# Altium footprint library PCB_Footprints.PcbLib: 303 footprints (part 13 of 19)
Each footprint in its own frame and in the unit in brackets; x right, y up, seen from the top. Pads: shape width x height; smd on the part's side, far side on the other; paste and mask are expansions set on the pad; w line width, h text height; cw(c..) or ccw(c..) is an arc to the next point about the centre after c.
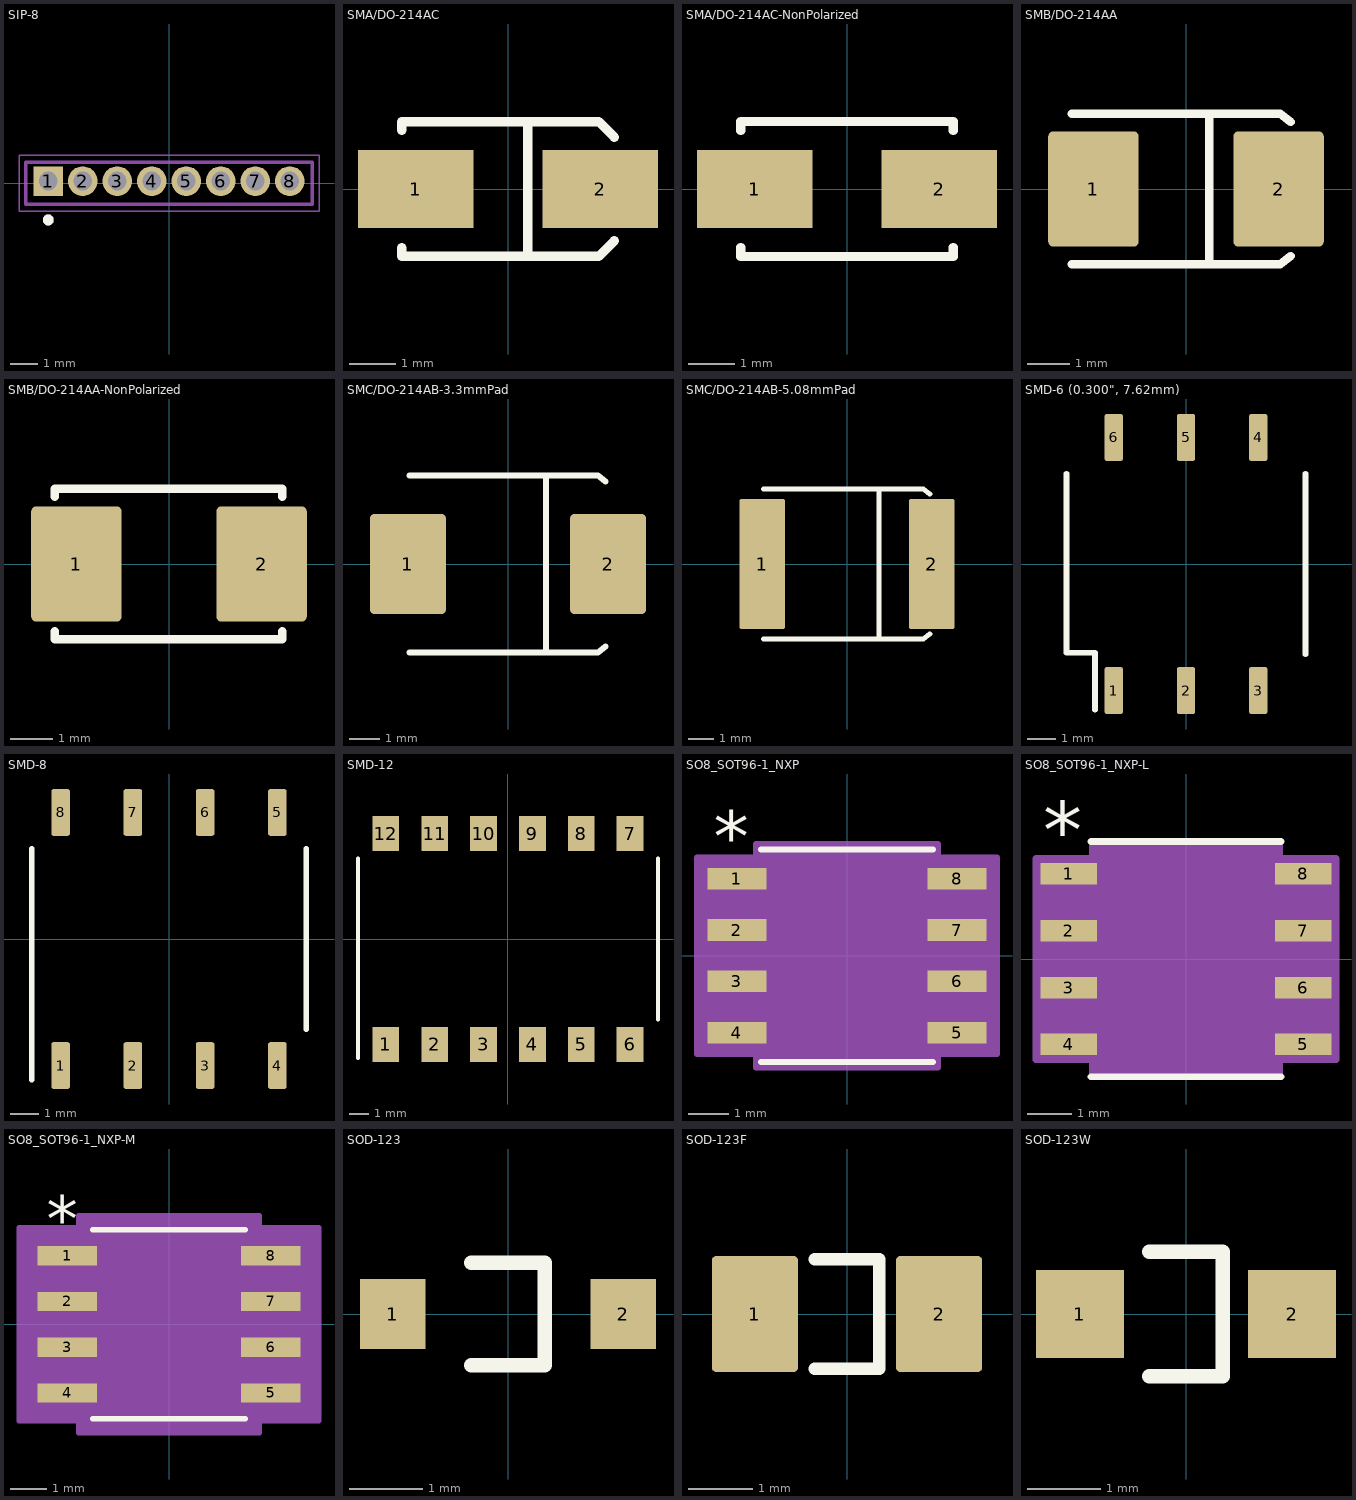
[diagram p12: the footprints below, top view; thin cyan lines are the x and y axes]

## SIP-8 [mm]
pads (8):
  rect 1.09x1.09 hole 0.69: 1(-4.445,0.078)
  round 1.09 hole 0.69: 2(-3.175,0.078) 3(-1.905,0.078) 4(-0.635,0.078) 5(0.635,0.078) 6(1.905,0.078) 7(3.175,0.078) 8(4.445,0.078)
Top Overlay:
  circle w0.2: c-4.445,-1.35 r0.1
Mechanical 13:
  circle w0.2: c-4.445,-1.35 r0.1
  lines w0.127: -5.271,-0.775 5.271,-0.775 5.271,0.775 -5.271,0.775 -5.271,-0.775
Mechanical 15:
  lines w0.05: -5.52,-1.025 -5.52,1.025 5.52,1.025 5.52,-1.025 -5.52,-1.025
3D body "step_temp.STEP": height 3.99, standoff -3.31, extent -5.271,-0.775 5.271,0.775

## SMA/DO-214AC [mm] "SMA, DO-214AC. From Diode DS19005 rev 16-2"
pads (2):
  rect 2.5x1.7 smd: 1(-2,0) 2(2,0)
Top Overlay:
  lines w0.203: -2.3,-1.27 -2.3,-1.46 1.778,-1.46 1.965,-1.46 2.3,-1.125 ; -2.3,1.27 -2.3,1.46 1.778,1.46 1.965,1.46 2.3,1.125 ; 0.425,-1.46 0.425,1.46
3D body "SW3dPS-S1G (SMA).STEP": height 2.08, standoff -0.05, extent -2.553,-1.333 2.553,1.334

## SMA/DO-214AC-NonPolarized [mm] "SMA, DO-214AC. From Diode DS19005 rev 16-2"
height 2.4
pads (2):
  rect 2.5x1.7 smd: 1(-2,0) 2(2,0)
Top Overlay:
  lines w0.2: -2.3,-1.27 -2.3,-1.46 2.3,-1.46 2.3,-1.27 ; -2.3,1.27 -2.3,1.46 2.3,1.46 2.3,1.27
3D body "SW3dPS-S1G (SMA).STEP": height 2.08, standoff -0.05, extent -2.553,-1.333 2.553,1.334

## SMB/DO-214AA [mm] "SMB, DO-214AA. From ON Semi case 403A-03 Issue J"
height 2.28
pads (2):
  rrect10% 2.159x2.743 smd: 1(-2.21,0) 2(2.21,0)
Top Overlay:
  lines w0.2: -2.725,-1.8 2.25,-1.8 2.5,-1.6 ; -2.725,1.8 2.25,1.8 2.5,1.6
  lines w0.203: 0.55,-1.8 0.55,1.8
3D body "User Library-DO-214AA SMB.step": height 2.32, standoff 0.01, extent -2.7,-1.8 2.7,1.8

## SMB/DO-214AA-NonPolarized [mm] "SMB, DO-214AA. From ON Semi case 403A-03 Issue J"
height 2.28
pads (2):
  rrect10% 2.159x2.743 smd: 1(-2.21,0) 2(2.21,0)
Top Overlay:
  lines w0.2: -2.725,-1.61 -2.725,-1.8 2.7,-1.8 2.7,-1.61 ; -2.725,1.61 -2.725,1.8 2.7,1.8 2.7,1.61
3D body "User Library-DO-214AA SMB.step": height 2.32, standoff 0.01, extent -2.7,-1.8 2.7,1.8

## SMC/DO-214AB-3.3mmPad [mm] "SMC, DO-214AB from MCC S10ML"
height 2.62
pads (2):
  rrect10% 2.5x3.3 smd: 1(-3.302,0) 2(3.302,0)
Top Overlay:
  lines w0.2: -3.25,-2.925 2.975,-2.925 3.225,-2.725 ; -3.25,2.925 2.975,2.925 3.225,2.725
  lines w0.203: 1.25,-2.925 1.25,2.925
3D body "User Library-DO-214AB SMC.step": height 2.32, standoff 0.01, extent -3.975,-2.95 3.975,2.95

## SMC/DO-214AB-5.08mmPad [mil] "SMC, DO-214AB from MCC FR10M"
height 204.72
pads (2):
  rrect10% 70x200 smd: 1(-130,0) 2(130,0)
Top Overlay:
  lines w7.87: -127.95,-115.16 117.13,-115.16 126.97,-107.29 ; -127.95,115.16 117.13,115.16 126.97,107.29
  lines w8: 49.21,-115.16 49.21,115.16
3D body "User Library-DO-214AB SMC.step": height 91.15, standoff 0.5, extent -156.49,-116.14 156.5,116.14

## SMD-6 (0.300", 7.62mm) [mm] "6-SMD, L-Bend, from IXYS LCB710S datasheet"
height 4.445
pads (6):
  rrect25% 0.65x1.65 smd: 1(-2.54,-4.45) 2(0,-4.45) 3(2.54,-4.45) 4(2.54,4.45) 5(0,4.45) 6(-2.54,4.45)
Top Overlay:
  lines w0.2: -4.2,3.175 -4.2,-3.125 -3.2,-3.125 -3.2,-5.125 ; 4.2,-3.175 4.2,3.175
3D body: height 0.25, standoff 0, extent -4.2,-3.175 4.2,3.175

## SMD-8 [mm] "8-SMD, L-Bend, from IXYS FDA217S"
height 3.35
pads (8):
  rrect25% 0.65x1.65 smd: 1(-3.81,-4.45) 2(-1.27,-4.45) 3(1.27,-4.45) 4(3.81,-4.45) 5(3.81,4.45) 6(1.27,4.45) 7(-1.27,4.45) 8(-3.81,4.45)
Top Overlay:
  lines w0.2: -4.826,-4.953 -4.826,3.175 ; 4.826,-3.175 4.826,3.175
3D body: height 3.35, standoff 0, extent -4.826,-3.175 4.826,3.175

## SMD-12 [mm] "12-SMD, L-Bend, from Murata SCA100T datasheet"
height 5.4
pads (12):
  rect 1.39x1.81 smd: 1(-6.35,-5.48) 2(-3.81,-5.48) 3(-1.27,-5.48) 4(1.27,-5.48) 5(3.81,-5.48) 6(6.35,-5.48) 7(6.35,5.48) 8(3.81,5.48) 9(1.27,5.48) 10(-1.27,5.48) 11(-3.81,5.48) 12(-6.35,5.48)
Top Overlay:
  lines w0.2: -7.8,-6.2 -7.8,4.2 ; 7.8,-4.2 7.8,4.2
3D body "User Library-SCA100T.step": height 5.3, standoff -0.03, extent -7.8,-5.7 7.8,5.7

## SO8_SOT96-1_NXP [mil]
pads (8):
  rect 57.5x21 smd paste+0 mask+0: 1(-107.25,75) 2(-107.25,25) 3(-107.25,-25) 4(-107.25,-75) 5(107.25,-75) 6(107.25,-25) 7(107.25,25) 8(107.25,75)
Top Overlay:
  lines w6: -83.5,-103.5 83.5,-103.5 ; -83.5,103.5 83.5,103.5
  text "*" at -129.75,91 h50
Mechanical 13:
  lines w0: -12,98.5 ccw(c0,98.5) 12,98.5
  lines w1: -122,-84.5 -122,-65.5 -78.5,-65.5 -78.5,-84.5 -122,-84.5 ; -122,-34.5 -122,-15.5 -78.5,-15.5 -78.5,-34.5 -122,-34.5 ; -122,15.5 -122,34.5 -78.5,34.5 -78.5,15.5 -122,15.5 ; -122,65.5 -122,84.5 -78.5,84.5 -78.5,65.5 -122,65.5 ; -78.5,-98.5 78.5,-98.5 78.5,98.5 -78.5,98.5 -78.5,-98.5 ; 78.5,-84.5 78.5,-65.5 122,-65.5 122,-84.5 78.5,-84.5 ; 78.5,-34.5 78.5,-15.5 122,-15.5 122,-34.5 78.5,-34.5 ; 78.5,15.5 78.5,34.5 122,34.5 122,15.5 78.5,15.5 ; 78.5,65.5 78.5,84.5 122,84.5 122,65.5 78.5,65.5
  text "*" at -76,45.5 h50
Mechanical 15:
  region: -88.5,-95.5 -146,-95.5 -146,95.5 -88.5,95.5 -88.5,108.5 88.5,108.5 88.5,95.5 146,95.5 146,-95.5 88.5,-95.5 88.5,-108.5 -88.5,-108.5
  lines w6: -146,-95.5 -146,95.5 -88.5,95.5 -88.5,108.5 88.5,108.5 88.5,95.5 146,95.5 146,-95.5 88.5,-95.5 88.5,-108.5 -88.5,-108.5 -88.5,-95.5 -146,-95.5
3D body "SO8_SOT96-1_NXP.step": height 69.09, standoff 0, extent -122.01,-98.5 122.01,98.5

## SO8_SOT96-1_NXP-L [mil]
pads (8):
  rect 49.5x19 smd paste+0 mask+0: 1(-103.25,75) 2(-103.25,25) 3(-103.25,-25) 4(-103.25,-75) 5(103.25,-75) 6(103.25,-25) 7(103.25,25) 8(103.25,75)
Top Overlay:
  lines w6: -83.5,-103.5 83.5,-103.5 ; -83.5,103.5 83.5,103.5
  text "*" at -125.75,89 h50
Mechanical 13:
  lines w0: -12,98.5 ccw(c0,98.5) 12,98.5
  lines w1: -122,-84.5 -78.5,-84.5 -78.5,-65.5 -122,-65.5 -122,-84.5 ; -122,-34.5 -78.5,-34.5 -78.5,-15.5 -122,-15.5 -122,-34.5 ; -122,15.5 -78.5,15.5 -78.5,34.5 -122,34.5 -122,15.5 ; -122,65.5 -78.5,65.5 -78.5,84.5 -122,84.5 -122,65.5 ; -78.5,-98.5 -78.5,98.5 78.5,98.5 78.5,-98.5 -78.5,-98.5 ; 78.5,-84.5 122,-84.5 122,-65.5 78.5,-65.5 78.5,-84.5 ; 78.5,-34.5 122,-34.5 122,-15.5 78.5,-15.5 78.5,-34.5 ; 78.5,15.5 122,15.5 122,34.5 78.5,34.5 78.5,15.5 ; 78.5,65.5 122,65.5 122,84.5 78.5,84.5 78.5,65.5
  text "*" at -76,45.5 h50
Mechanical 15:
  region: -82.5,-88.5 -132,-88.5 -132,88.5 -82.5,88.5 -82.5,102.5 82.5,102.5 82.5,88.5 132,88.5 132,-88.5 82.5,-88.5 82.5,-102.5 -82.5,-102.5
  lines w6: -132,-88.5 -82.5,-88.5 -82.5,-102.5 82.5,-102.5 82.5,-88.5 132,-88.5 132,88.5 82.5,88.5 82.5,102.5 -82.5,102.5 -82.5,88.5 -132,88.5 -132,-88.5
3D body "SO8_SOT96-1_NXP.step": height 69.09, standoff 0, extent -122.01,-98.5 122.01,98.5

## SO8_SOT96-1_NXP-M [mil]
pads (8):
  rect 65.5x21 smd paste+0 mask+0: 1(-111.25,75) 2(-111.25,25) 3(-111.25,-25) 4(-111.25,-75) 5(111.25,-75) 6(111.25,-25) 7(111.25,25) 8(111.25,75)
Top Overlay:
  lines w6: -83.5,-103.5 83.5,-103.5 ; -83.5,103.5 83.5,103.5
  text "*" at -133.75,91 h50
Mechanical 13:
  lines w0: -12,98.5 ccw(c0,98.5) 12,98.5
  lines w1: -122,-84.5 -78.5,-84.5 -78.5,-65.5 -122,-65.5 -122,-84.5 ; -122,-34.5 -78.5,-34.5 -78.5,-15.5 -122,-15.5 -122,-34.5 ; -122,15.5 -78.5,15.5 -78.5,34.5 -122,34.5 -122,15.5 ; -122,65.5 -78.5,65.5 -78.5,84.5 -122,84.5 -122,65.5 ; -78.5,-98.5 -78.5,98.5 78.5,98.5 78.5,-98.5 -78.5,-98.5 ; 78.5,-84.5 122,-84.5 122,-65.5 78.5,-65.5 78.5,-84.5 ; 78.5,-34.5 122,-34.5 122,-15.5 78.5,-15.5 78.5,-34.5 ; 78.5,15.5 122,15.5 122,34.5 78.5,34.5 78.5,15.5 ; 78.5,65.5 122,65.5 122,84.5 78.5,84.5 78.5,65.5
  text "*" at -76,45.5 h50
Mechanical 15:
  region: -98.5,-105.5 -164,-105.5 -164,105.5 -98.5,105.5 -98.5,118.5 98.5,118.5 98.5,105.5 164,105.5 164,-105.5 98.5,-105.5 98.5,-118.5 -98.5,-118.5
  lines w6: -164,-105.5 -98.5,-105.5 -98.5,-118.5 98.5,-118.5 98.5,-105.5 164,-105.5 164,105.5 98.5,105.5 98.5,118.5 -98.5,118.5 -98.5,105.5 -164,105.5 -164,-105.5
3D body "SO8_SOT96-1_NXP.step": height 69.09, standoff 0, extent -122.01,-98.5 122.01,98.5

## SOD-123 [mm] "SOD-123. From Diodes DDZ6V2B-7 datasheet"
height 1.1
pads (2):
  rect 0.9x0.95 smd: 1(-1.575,0) 2(1.575,0)
Top Overlay:
  lines w0.2: -0.5,-0.7 0.5,-0.7 0.5,0.7 -0.5,0.7
3D body "User Library-SOD123.step": height 1.27, standoff 0, extent -1.85,-0.8 1.85,0.8

## SOD-123F [mm] "SOD-123F from https://www.diodes.com/assets/Package-Files/SOD123F.pdf on 2017-03-16"
height 1.15
pads (2):
  rrect10% 1.34x1.8 smd: 1(-1.43,0) 2(1.43,0)
Top Overlay:
  lines w0.2: -0.5,-0.85 0.5,-0.85 0.5,0.85 -0.5,0.85
3D body "User Library-SOD123F.step": height 1.22, standoff 0.01, extent -1.85,-0.85 1.9,0.85

## SOD-123W [mm] "SOD-123W. NXP PTVSxS1UR series"
height 1.1
pads (2):
  rect 1.2x1.2 smd: 1(-1.45,0) 2(1.45,0)
Top Overlay:
  lines w0.2: -0.5,-0.85 0.5,-0.85 0.5,0.85 -0.5,0.85
3D body: height 1.1, standoff 0, extent -1.4,-0.95 0.675,0.95
3D body: height 1.1, standoff 0, extent 1.1,-0.95 1.4,0.95
3D body: height 1.1, standoff 0, extent 0.675,-0.95 1.1,0.95